# Altium footprint library ST封装.PcbLib: 1336 footprints (part 81 of 109)
Each footprint in its own frame and in the unit in brackets; x right, y up, seen from the top. Pads: shape width x height; smd on the part's side, far side on the other; paste and mask are expansions set on the pad; w line width, h text height; cw(c..) or ccw(c..) is an arc to the next point about the centre after c.
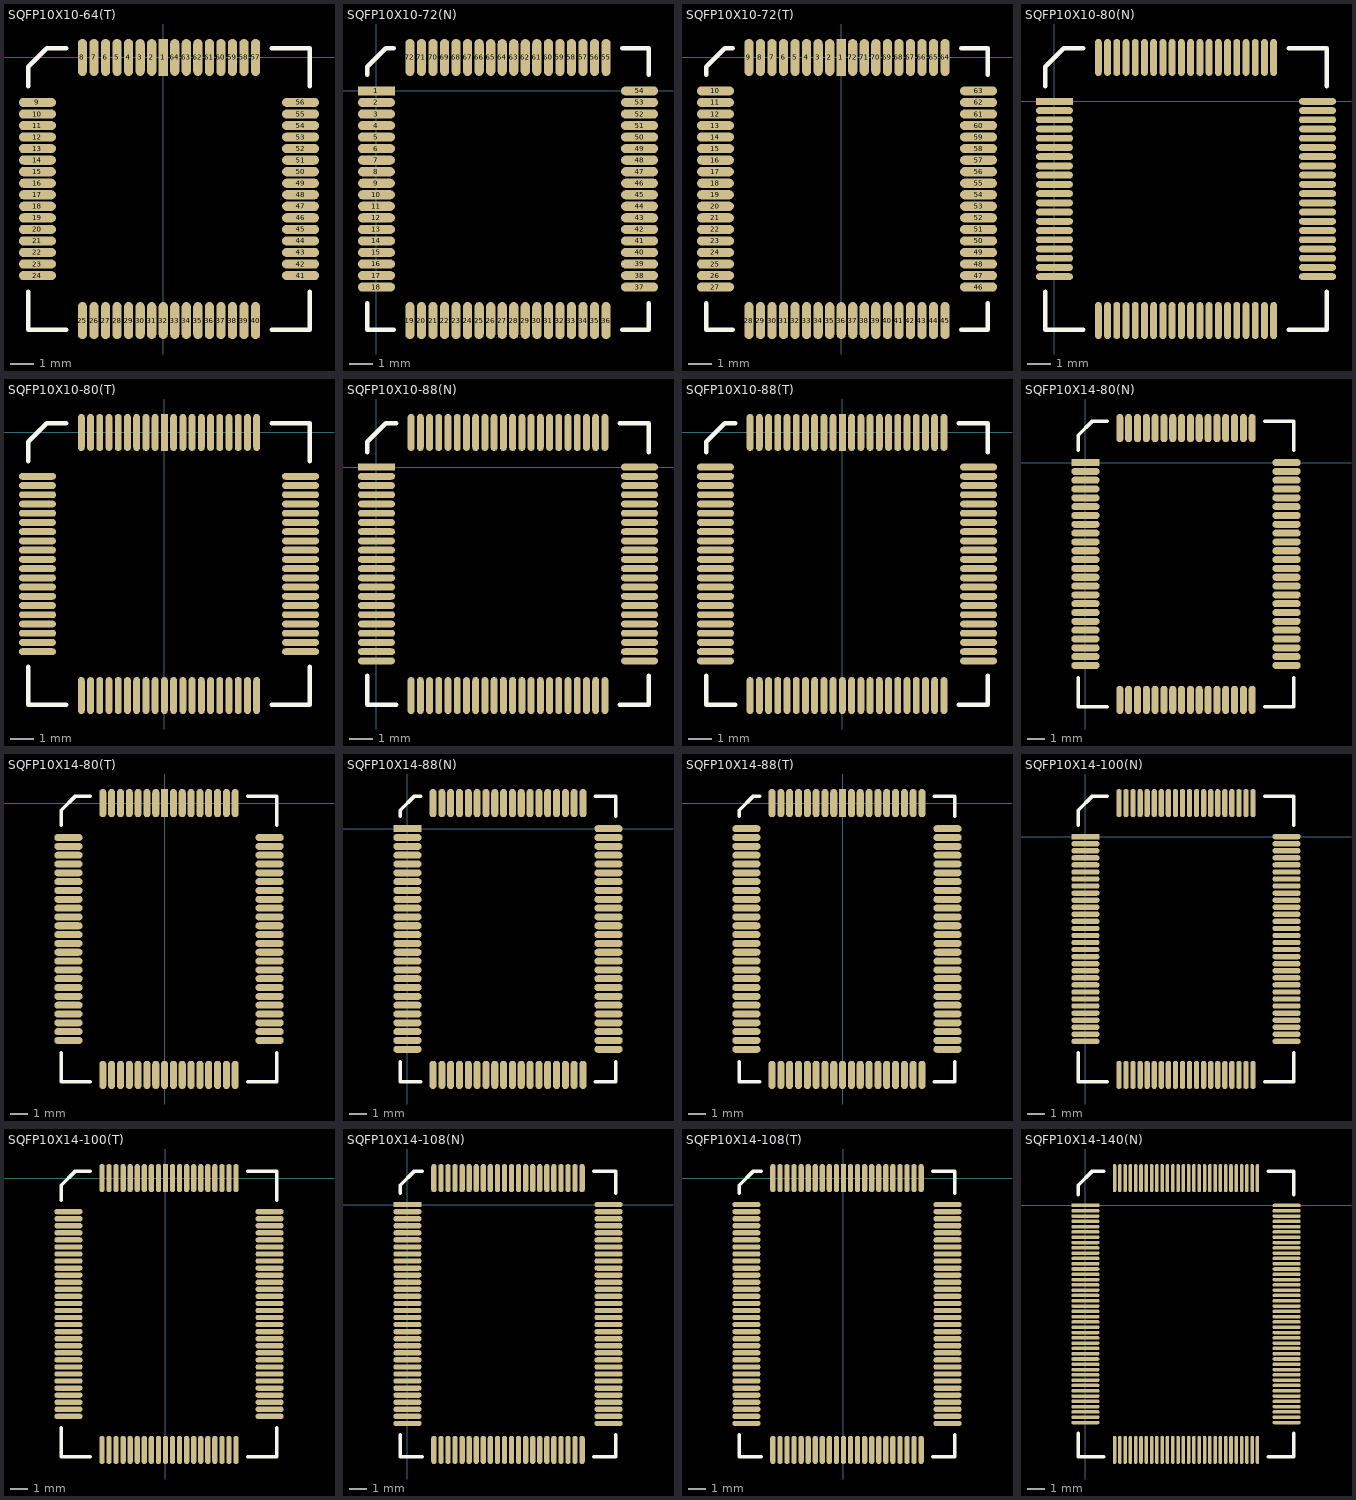
[diagram p80: the footprints below, top view; thin cyan lines are the x and y axes]

## SQFP10X10-64(T) [mm]
pads (64):
  rect 0.4x1.6 smd: 1(0,0)
  oval 0.4x1.6 smd: 2(-0.5,0) 3(-1,0) 4(-1.5,0) 5(-2,0) 6(-2.5,0) 7(-3,0) 8(-3.5,0) 25(-3.5,-11.4) 26(-3,-11.4) 27(-2.5,-11.4) 28(-2,-11.4) 29(-1.5,-11.4) 30(-1,-11.4) 31(-0.5,-11.4) 32(0,-11.4) 33(0.5,-11.4) 34(1,-11.4) 35(1.5,-11.4) 36(2,-11.4) 37(2.5,-11.4) 38(3,-11.4) 39(3.5,-11.4) 40(4,-11.4) 57(4,0) 58(3.5,0) 59(3,0) 60(2.5,0) 61(2,0) 62(1.5,0) 63(1,0) 64(0.5,0)
  oval 1.6x0.4 smd: 9(-5.45,-1.95) 10(-5.45,-2.45) 11(-5.45,-2.95) 12(-5.45,-3.45) 13(-5.45,-3.95) 14(-5.45,-4.45) 15(-5.45,-4.95) 16(-5.45,-5.45) 17(-5.45,-5.95) 18(-5.45,-6.45) 19(-5.45,-6.95) 20(-5.45,-7.45) 21(-5.45,-7.95) 22(-5.45,-8.45) 23(-5.45,-8.95) 24(-5.45,-9.45) 41(5.95,-9.45) 42(5.95,-8.95) 43(5.95,-8.45) 44(5.95,-7.95) 45(5.95,-7.45) 46(5.95,-6.95) 47(5.95,-6.45) 48(5.95,-5.95) 49(5.95,-5.45) 50(5.95,-4.95) 51(5.95,-4.45) 52(5.95,-3.95) 53(5.95,-3.45) 54(5.95,-2.95) 55(5.95,-2.45) 56(5.95,-1.95)
Top Overlay:
  lines w0.2: -5.85,-10.15 -5.85,-11.8 -4.2,-11.8 ; -5.85,-1.25 -5.85,-0.4 -5.05,0.4 -4.2,0.4 ; 4.7,-11.8 6.35,-11.8 6.35,-10.15 ; 4.7,0.4 6.35,0.4 6.35,-1.25

## SQFP10X10-72(N) [mm]
pads (72):
  rect 1.6x0.4 smd: 1(0,0)
  oval 1.6x0.4 smd: 2(0,-0.5) 3(0,-1) 4(0,-1.5) 5(0,-2) 6(0,-2.5) 7(0,-3) 8(0,-3.5) 9(0,-4) 10(0,-4.5) 11(0,-5) 12(0,-5.5) 13(0,-6) 14(0,-6.5) 15(0,-7) 16(0,-7.5) 17(0,-8) 18(0,-8.5) 37(11.4,-8.5) 38(11.4,-8) 39(11.4,-7.5) 40(11.4,-7) 41(11.4,-6.5) 42(11.4,-6) 43(11.4,-5.5) 44(11.4,-5) 45(11.4,-4.5) 46(11.4,-4) 47(11.4,-3.5) 48(11.4,-3) 49(11.4,-2.5) 50(11.4,-2) 51(11.4,-1.5) 52(11.4,-1) 53(11.4,-0.5) 54(11.4,0)
  oval 0.4x1.6 smd: 19(1.45,-9.95) 20(1.95,-9.95) 21(2.45,-9.95) 22(2.95,-9.95) 23(3.45,-9.95) 24(3.95,-9.95) 25(4.45,-9.95) 26(4.95,-9.95) 27(5.45,-9.95) 28(5.95,-9.95) 29(6.45,-9.95) 30(6.95,-9.95) 31(7.45,-9.95) 32(7.95,-9.95) 33(8.45,-9.95) 34(8.95,-9.95) 35(9.45,-9.95) 36(9.95,-9.95) 55(9.95,1.45) 56(9.45,1.45) 57(8.95,1.45) 58(8.45,1.45) 59(7.95,1.45) 60(7.45,1.45) 61(6.95,1.45) 62(6.45,1.45) 63(5.95,1.45) 64(5.45,1.45) 65(4.95,1.45) 66(4.45,1.45) 67(3.95,1.45) 68(3.45,1.45) 69(2.95,1.45) 70(2.45,1.45) 71(1.95,1.45) 72(1.45,1.45)
Top Overlay:
  lines w0.2: -0.4,-9.2 -0.4,-10.35 0.75,-10.35 ; -0.4,0.7 -0.4,1.05 0.4,1.85 0.75,1.85 ; 10.65,-10.35 11.8,-10.35 11.8,-9.2 ; 10.65,1.85 11.8,1.85 11.8,0.7

## SQFP10X10-72(T) [mm]
pads (72):
  rect 0.4x1.6 smd: 1(0,0)
  oval 0.4x1.6 smd: 2(-0.5,0) 3(-1,0) 4(-1.5,0) 5(-2,0) 6(-2.5,0) 7(-3,0) 8(-3.5,0) 9(-4,0) 28(-4,-11.4) 29(-3.5,-11.4) 30(-3,-11.4) 31(-2.5,-11.4) 32(-2,-11.4) 33(-1.5,-11.4) 34(-1,-11.4) 35(-0.5,-11.4) 36(0,-11.4) 37(0.5,-11.4) 38(1,-11.4) 39(1.5,-11.4) 40(2,-11.4) 41(2.5,-11.4) 42(3,-11.4) 43(3.5,-11.4) 44(4,-11.4) 45(4.5,-11.4) 64(4.5,0) 65(4,0) 66(3.5,0) 67(3,0) 68(2.5,0) 69(2,0) 70(1.5,0) 71(1,0) 72(0.5,0)
  oval 1.6x0.4 smd: 10(-5.45,-1.45) 11(-5.45,-1.95) 12(-5.45,-2.45) 13(-5.45,-2.95) 14(-5.45,-3.45) 15(-5.45,-3.95) 16(-5.45,-4.45) 17(-5.45,-4.95) 18(-5.45,-5.45) 19(-5.45,-5.95) 20(-5.45,-6.45) 21(-5.45,-6.95) 22(-5.45,-7.45) 23(-5.45,-7.95) 24(-5.45,-8.45) 25(-5.45,-8.95) 26(-5.45,-9.45) 27(-5.45,-9.95) 46(5.95,-9.95) 47(5.95,-9.45) 48(5.95,-8.95) 49(5.95,-8.45) 50(5.95,-7.95) 51(5.95,-7.45) 52(5.95,-6.95) 53(5.95,-6.45) 54(5.95,-5.95) 55(5.95,-5.45) 56(5.95,-4.95) 57(5.95,-4.45) 58(5.95,-3.95) 59(5.95,-3.45) 60(5.95,-2.95) 61(5.95,-2.45) 62(5.95,-1.95) 63(5.95,-1.45)
Top Overlay:
  lines w0.2: -5.85,-10.65 -5.85,-11.8 -4.7,-11.8 ; -5.85,-0.75 -5.85,-0.4 -5.05,0.4 -4.7,0.4 ; 5.2,-11.8 6.35,-11.8 6.35,-10.65 ; 5.2,0.4 6.35,0.4 6.35,-0.75

## SQFP10X10-80(N) [mm]
pads (80):
  rect 1.6x0.3 smd: 1(0,0)
  oval 1.6x0.3 smd: 2(0,-0.4) 3(0,-0.8) 4(0,-1.2) 5(0,-1.6) 6(0,-2) 7(0,-2.4) 8(0,-2.8) 9(0,-3.2) 10(0,-3.6) 11(0,-4) 12(0,-4.4) 13(0,-4.8) 14(0,-5.2) 15(0,-5.6) 16(0,-6) 17(0,-6.4) 18(0,-6.8) 19(0,-7.2) 20(0,-7.6) 41(11.4,-7.6) 42(11.4,-7.2) 43(11.4,-6.8) 44(11.4,-6.4) 45(11.4,-6) 46(11.4,-5.6) 47(11.4,-5.2) 48(11.4,-4.8) 49(11.4,-4.4) 50(11.4,-4) 51(11.4,-3.6) 52(11.4,-3.2) 53(11.4,-2.8) 54(11.4,-2.4) 55(11.4,-2) 56(11.4,-1.6) 57(11.4,-1.2) 58(11.4,-0.8) 59(11.4,-0.4) 60(11.4,0)
  oval 0.3x1.6 smd: 21(1.9,-9.5) 22(2.3,-9.5) 23(2.7,-9.5) 24(3.1,-9.5) 25(3.5,-9.5) 26(3.9,-9.5) 27(4.3,-9.5) 28(4.7,-9.5) 29(5.1,-9.5) 30(5.5,-9.5) 31(5.9,-9.5) 32(6.3,-9.5) 33(6.7,-9.5) 34(7.1,-9.5) 35(7.5,-9.5) 36(7.9,-9.5) 37(8.3,-9.5) 38(8.7,-9.5) 39(9.1,-9.5) 40(9.5,-9.5) 61(9.5,1.9) 62(9.1,1.9) 63(8.7,1.9) 64(8.3,1.9) 65(7.9,1.9) 66(7.5,1.9) 67(7.1,1.9) 68(6.7,1.9) 69(6.3,1.9) 70(5.9,1.9) 71(5.5,1.9) 72(5.1,1.9) 73(4.7,1.9) 74(4.3,1.9) 75(3.9,1.9) 76(3.5,1.9) 77(3.1,1.9) 78(2.7,1.9) 79(2.3,1.9) 80(1.9,1.9)
Top Overlay:
  lines w0.2: -0.4,-8.25 -0.4,-9.9 1.25,-9.9 ; -0.4,0.65 -0.4,1.5 0.4,2.3 1.25,2.3 ; 10.15,-9.9 11.8,-9.9 11.8,-8.25 ; 10.15,2.3 11.8,2.3 11.8,0.65

## SQFP10X10-80(T) [mm]
pads (80):
  rect 0.3x1.6 smd: 1(0,0)
  oval 0.3x1.6 smd: 2(-0.4,0) 3(-0.8,0) 4(-1.2,0) 5(-1.6,0) 6(-2,0) 7(-2.4,0) 8(-2.8,0) 9(-3.2,0) 10(-3.6,0) 31(-3.6,-11.4) 32(-3.2,-11.4) 33(-2.8,-11.4) 34(-2.4,-11.4) 35(-2,-11.4) 36(-1.6,-11.4) 37(-1.2,-11.4) 38(-0.8,-11.4) 39(-0.4,-11.4) 40(0,-11.4) 41(0.4,-11.4) 42(0.8,-11.4) 43(1.2,-11.4) 44(1.6,-11.4) 45(2,-11.4) 46(2.4,-11.4) 47(2.8,-11.4) 48(3.2,-11.4) 49(3.6,-11.4) 50(4,-11.4) 71(4,0) 72(3.6,0) 73(3.2,0) 74(2.8,0) 75(2.4,0) 76(2,0) 77(1.6,0) 78(1.2,0) 79(0.8,0) 80(0.4,0)
  oval 1.6x0.3 smd: 11(-5.5,-1.9) 12(-5.5,-2.3) 13(-5.5,-2.7) 14(-5.5,-3.1) 15(-5.5,-3.5) 16(-5.5,-3.9) 17(-5.5,-4.3) 18(-5.5,-4.7) 19(-5.5,-5.1) 20(-5.5,-5.5) 21(-5.5,-5.9) 22(-5.5,-6.3) 23(-5.5,-6.7) 24(-5.5,-7.1) 25(-5.5,-7.5) 26(-5.5,-7.9) 27(-5.5,-8.3) 28(-5.5,-8.7) 29(-5.5,-9.1) 30(-5.5,-9.5) 51(5.9,-9.5) 52(5.9,-9.1) 53(5.9,-8.7) 54(5.9,-8.3) 55(5.9,-7.9) 56(5.9,-7.5) 57(5.9,-7.1) 58(5.9,-6.7) 59(5.9,-6.3) 60(5.9,-5.9) 61(5.9,-5.5) 62(5.9,-5.1) 63(5.9,-4.7) 64(5.9,-4.3) 65(5.9,-3.9) 66(5.9,-3.5) 67(5.9,-3.1) 68(5.9,-2.7) 69(5.9,-2.3) 70(5.9,-1.9)
Top Overlay:
  lines w0.2: -5.9,-10.15 -5.9,-11.8 -4.25,-11.8 ; -5.9,-1.25 -5.9,-0.4 -5.1,0.4 -4.25,0.4 ; 4.65,-11.8 6.3,-11.8 6.3,-10.15 ; 4.65,0.4 6.3,0.4 6.3,-1.25

## SQFP10X10-88(N) [mm]
pads (88):
  rect 1.6x0.3 smd: 1(0,0)
  oval 1.6x0.3 smd: 2(0,-0.4) 3(0,-0.8) 4(0,-1.2) 5(0,-1.6) 6(0,-2) 7(0,-2.4) 8(0,-2.8) 9(0,-3.2) 10(0,-3.6) 11(0,-4) 12(0,-4.4) 13(0,-4.8) 14(0,-5.2) 15(0,-5.6) 16(0,-6) 17(0,-6.4) 18(0,-6.8) 19(0,-7.2) 20(0,-7.6) 21(0,-8) 22(0,-8.4) 45(11.4,-8.4) 46(11.4,-8) 47(11.4,-7.6) 48(11.4,-7.2) 49(11.4,-6.8) 50(11.4,-6.4) 51(11.4,-6) 52(11.4,-5.6) 53(11.4,-5.2) 54(11.4,-4.8) 55(11.4,-4.4) 56(11.4,-4) 57(11.4,-3.6) 58(11.4,-3.2) 59(11.4,-2.8) 60(11.4,-2.4) 61(11.4,-2) 62(11.4,-1.6) 63(11.4,-1.2) 64(11.4,-0.8) 65(11.4,-0.4) 66(11.4,0)
  oval 0.3x1.6 smd: 23(1.5,-9.9) 24(1.9,-9.9) 25(2.3,-9.9) 26(2.7,-9.9) 27(3.1,-9.9) 28(3.5,-9.9) 29(3.9,-9.9) 30(4.3,-9.9) 31(4.7,-9.9) 32(5.1,-9.9) 33(5.5,-9.9) 34(5.9,-9.9) 35(6.3,-9.9) 36(6.7,-9.9) 37(7.1,-9.9) 38(7.5,-9.9) 39(7.9,-9.9) 40(8.3,-9.9) 41(8.7,-9.9) 42(9.1,-9.9) 43(9.5,-9.9) 44(9.9,-9.9) 67(9.9,1.5) 68(9.5,1.5) 69(9.1,1.5) 70(8.7,1.5) 71(8.3,1.5) 72(7.9,1.5) 73(7.5,1.5) 74(7.1,1.5) 75(6.7,1.5) 76(6.3,1.5) 77(5.9,1.5) 78(5.5,1.5) 79(5.1,1.5) 80(4.7,1.5) 81(4.3,1.5) 82(3.9,1.5) 83(3.5,1.5) 84(3.1,1.5) 85(2.7,1.5) 86(2.3,1.5) 87(1.9,1.5) 88(1.5,1.5)
Top Overlay:
  lines w0.2: -0.4,-9.05 -0.4,-10.3 0.85,-10.3 ; -0.4,0.65 -0.4,1.1 0.4,1.9 0.85,1.9 ; 10.55,-10.3 11.8,-10.3 11.8,-9.05 ; 10.55,1.9 11.8,1.9 11.8,0.65

## SQFP10X10-88(T) [mm]
pads (88):
  rect 0.3x1.6 smd: 1(0,0)
  oval 0.3x1.6 smd: 2(-0.4,0) 3(-0.8,0) 4(-1.2,0) 5(-1.6,0) 6(-2,0) 7(-2.4,0) 8(-2.8,0) 9(-3.2,0) 10(-3.6,0) 11(-4,0) 34(-4,-11.4) 35(-3.6,-11.4) 36(-3.2,-11.4) 37(-2.8,-11.4) 38(-2.4,-11.4) 39(-2,-11.4) 40(-1.6,-11.4) 41(-1.2,-11.4) 42(-0.8,-11.4) 43(-0.4,-11.4) 44(0,-11.4) 45(0.4,-11.4) 46(0.8,-11.4) 47(1.2,-11.4) 48(1.6,-11.4) 49(2,-11.4) 50(2.4,-11.4) 51(2.8,-11.4) 52(3.2,-11.4) 53(3.6,-11.4) 54(4,-11.4) 55(4.4,-11.4) 78(4.4,0) 79(4,0) 80(3.6,0) 81(3.2,0) 82(2.8,0) 83(2.4,0) 84(2,0) 85(1.6,0) 86(1.2,0) 87(0.8,0) 88(0.4,0)
  oval 1.6x0.3 smd: 12(-5.5,-1.5) 13(-5.5,-1.9) 14(-5.5,-2.3) 15(-5.5,-2.7) 16(-5.5,-3.1) 17(-5.5,-3.5) 18(-5.5,-3.9) 19(-5.5,-4.3) 20(-5.5,-4.7) 21(-5.5,-5.1) 22(-5.5,-5.5) 23(-5.5,-5.9) 24(-5.5,-6.3) 25(-5.5,-6.7) 26(-5.5,-7.1) 27(-5.5,-7.5) 28(-5.5,-7.9) 29(-5.5,-8.3) 30(-5.5,-8.7) 31(-5.5,-9.1) 32(-5.5,-9.5) 33(-5.5,-9.9) 56(5.9,-9.9) 57(5.9,-9.5) 58(5.9,-9.1) 59(5.9,-8.7) 60(5.9,-8.3) 61(5.9,-7.9) 62(5.9,-7.5) 63(5.9,-7.1) 64(5.9,-6.7) 65(5.9,-6.3) 66(5.9,-5.9) 67(5.9,-5.5) 68(5.9,-5.1) 69(5.9,-4.7) 70(5.9,-4.3) 71(5.9,-3.9) 72(5.9,-3.5) 73(5.9,-3.1) 74(5.9,-2.7) 75(5.9,-2.3) 76(5.9,-1.9) 77(5.9,-1.5)
Top Overlay:
  lines w0.2: -5.9,-10.55 -5.9,-11.8 -4.65,-11.8 ; -5.9,-0.85 -5.9,-0.4 -5.1,0.4 -4.65,0.4 ; 5.05,-11.8 6.3,-11.8 6.3,-10.55 ; 5.05,0.4 6.3,0.4 6.3,-0.85

## SQFP10X14-80(N) [mm]
pads (80):
  rect 1.6x0.4 smd: 1(0,0)
  oval 1.6x0.4 smd: 2(0,-0.5) 3(0,-1) 4(0,-1.5) 5(0,-2) 6(0,-2.5) 7(0,-3) 8(0,-3.5) 9(0,-4) 10(0,-4.5) 11(0,-5) 12(0,-5.5) 13(0,-6) 14(0,-6.5) 15(0,-7) 16(0,-7.5) 17(0,-8) 18(0,-8.5) 19(0,-9) 20(0,-9.5) 21(0,-10) 22(0,-10.5) 23(0,-11) 24(0,-11.5) 41(11.4,-11.5) 42(11.4,-11) 43(11.4,-10.5) 44(11.4,-10) 45(11.4,-9.5) 46(11.4,-9) 47(11.4,-8.5) 48(11.4,-8) 49(11.4,-7.5) 50(11.4,-7) 51(11.4,-6.5) 52(11.4,-6) 53(11.4,-5.5) 54(11.4,-5) 55(11.4,-4.5) 56(11.4,-4) 57(11.4,-3.5) 58(11.4,-3) 59(11.4,-2.5) 60(11.4,-2) 61(11.4,-1.5) 62(11.4,-1) 63(11.4,-0.5) 64(11.4,0)
  oval 0.4x1.6 smd: 25(1.95,-13.45) 26(2.45,-13.45) 27(2.95,-13.45) 28(3.45,-13.45) 29(3.95,-13.45) 30(4.45,-13.45) 31(4.95,-13.45) 32(5.45,-13.45) 33(5.95,-13.45) 34(6.45,-13.45) 35(6.95,-13.45) 36(7.45,-13.45) 37(7.95,-13.45) 38(8.45,-13.45) 39(8.95,-13.45) 40(9.45,-13.45) 65(9.45,1.95) 66(8.95,1.95) 67(8.45,1.95) 68(7.95,1.95) 69(7.45,1.95) 70(6.95,1.95) 71(6.45,1.95) 72(5.95,1.95) 73(5.45,1.95) 74(4.95,1.95) 75(4.45,1.95) 76(3.95,1.95) 77(3.45,1.95) 78(2.95,1.95) 79(2.45,1.95) 80(1.95,1.95)
Top Overlay:
  lines w0.2: -0.4,-12.2 -0.4,-13.85 1.25,-13.85 ; -0.4,0.7 -0.4,1.55 0.4,2.35 1.25,2.35 ; 10.15,-13.85 11.8,-13.85 11.8,-12.2 ; 10.15,2.35 11.8,2.35 11.8,0.7

## SQFP10X14-80(T) [mm]
pads (80):
  rect 0.4x1.6 smd: 1(0,0)
  oval 0.4x1.6 smd: 2(-0.5,0) 3(-1,0) 4(-1.5,0) 5(-2,0) 6(-2.5,0) 7(-3,0) 8(-3.5,0) 33(-3.5,-15.4) 34(-3,-15.4) 35(-2.5,-15.4) 36(-2,-15.4) 37(-1.5,-15.4) 38(-1,-15.4) 39(-0.5,-15.4) 40(0,-15.4) 41(0.5,-15.4) 42(1,-15.4) 43(1.5,-15.4) 44(2,-15.4) 45(2.5,-15.4) 46(3,-15.4) 47(3.5,-15.4) 48(4,-15.4) 73(4,0) 74(3.5,0) 75(3,0) 76(2.5,0) 77(2,0) 78(1.5,0) 79(1,0) 80(0.5,0)
  oval 1.6x0.4 smd: 9(-5.45,-1.95) 10(-5.45,-2.45) 11(-5.45,-2.95) 12(-5.45,-3.45) 13(-5.45,-3.95) 14(-5.45,-4.45) 15(-5.45,-4.95) 16(-5.45,-5.45) 17(-5.45,-5.95) 18(-5.45,-6.45) 19(-5.45,-6.95) 20(-5.45,-7.45) 21(-5.45,-7.95) 22(-5.45,-8.45) 23(-5.45,-8.95) 24(-5.45,-9.45) 25(-5.45,-9.95) 26(-5.45,-10.45) 27(-5.45,-10.95) 28(-5.45,-11.45) 29(-5.45,-11.95) 30(-5.45,-12.45) 31(-5.45,-12.95) 32(-5.45,-13.45) 49(5.95,-13.45) 50(5.95,-12.95) 51(5.95,-12.45) 52(5.95,-11.95) 53(5.95,-11.45) 54(5.95,-10.95) 55(5.95,-10.45) 56(5.95,-9.95) 57(5.95,-9.45) 58(5.95,-8.95) 59(5.95,-8.45) 60(5.95,-7.95) 61(5.95,-7.45) 62(5.95,-6.95) 63(5.95,-6.45) 64(5.95,-5.95) 65(5.95,-5.45) 66(5.95,-4.95) 67(5.95,-4.45) 68(5.95,-3.95) 69(5.95,-3.45) 70(5.95,-2.95) 71(5.95,-2.45) 72(5.95,-1.95)
Top Overlay:
  lines w0.2: -5.85,-14.15 -5.85,-15.8 -4.2,-15.8 ; -5.85,-1.25 -5.85,-0.4 -5.05,0.4 -4.2,0.4 ; 4.7,-15.8 6.35,-15.8 6.35,-14.15 ; 4.7,0.4 6.35,0.4 6.35,-1.25

## SQFP10X14-88(N) [mm]
pads (88):
  rect 1.6x0.4 smd: 1(0,0)
  oval 1.6x0.4 smd: 2(0,-0.5) 3(0,-1) 4(0,-1.5) 5(0,-2) 6(0,-2.5) 7(0,-3) 8(0,-3.5) 9(0,-4) 10(0,-4.5) 11(0,-5) 12(0,-5.5) 13(0,-6) 14(0,-6.5) 15(0,-7) 16(0,-7.5) 17(0,-8) 18(0,-8.5) 19(0,-9) 20(0,-9.5) 21(0,-10) 22(0,-10.5) 23(0,-11) 24(0,-11.5) 25(0,-12) 26(0,-12.5) 45(11.4,-12.5) 46(11.4,-12) 47(11.4,-11.5) 48(11.4,-11) 49(11.4,-10.5) 50(11.4,-10) 51(11.4,-9.5) 52(11.4,-9) 53(11.4,-8.5) 54(11.4,-8) 55(11.4,-7.5) 56(11.4,-7) 57(11.4,-6.5) 58(11.4,-6) 59(11.4,-5.5) 60(11.4,-5) 61(11.4,-4.5) 62(11.4,-4) 63(11.4,-3.5) 64(11.4,-3) 65(11.4,-2.5) 66(11.4,-2) 67(11.4,-1.5) 68(11.4,-1) 69(11.4,-0.5) 70(11.4,0)
  oval 0.4x1.6 smd: 27(1.45,-13.95) 28(1.95,-13.95) 29(2.45,-13.95) 30(2.95,-13.95) 31(3.45,-13.95) 32(3.95,-13.95) 33(4.45,-13.95) 34(4.95,-13.95) 35(5.45,-13.95) 36(5.95,-13.95) 37(6.45,-13.95) 38(6.95,-13.95) 39(7.45,-13.95) 40(7.95,-13.95) 41(8.45,-13.95) 42(8.95,-13.95) 43(9.45,-13.95) 44(9.95,-13.95) 71(9.95,1.45) 72(9.45,1.45) 73(8.95,1.45) 74(8.45,1.45) 75(7.95,1.45) 76(7.45,1.45) 77(6.95,1.45) 78(6.45,1.45) 79(5.95,1.45) 80(5.45,1.45) 81(4.95,1.45) 82(4.45,1.45) 83(3.95,1.45) 84(3.45,1.45) 85(2.95,1.45) 86(2.45,1.45) 87(1.95,1.45) 88(1.45,1.45)
Top Overlay:
  lines w0.2: -0.4,-13.2 -0.4,-14.35 0.75,-14.35 ; -0.4,0.7 -0.4,1.05 0.4,1.85 0.75,1.85 ; 10.65,-14.35 11.8,-14.35 11.8,-13.2 ; 10.65,1.85 11.8,1.85 11.8,0.7

## SQFP10X14-88(T) [mm]
pads (88):
  rect 0.4x1.6 smd: 1(0,0)
  oval 0.4x1.6 smd: 2(-0.5,0) 3(-1,0) 4(-1.5,0) 5(-2,0) 6(-2.5,0) 7(-3,0) 8(-3.5,0) 9(-4,0) 36(-4,-15.4) 37(-3.5,-15.4) 38(-3,-15.4) 39(-2.5,-15.4) 40(-2,-15.4) 41(-1.5,-15.4) 42(-1,-15.4) 43(-0.5,-15.4) 44(0,-15.4) 45(0.5,-15.4) 46(1,-15.4) 47(1.5,-15.4) 48(2,-15.4) 49(2.5,-15.4) 50(3,-15.4) 51(3.5,-15.4) 52(4,-15.4) 53(4.5,-15.4) 80(4.5,0) 81(4,0) 82(3.5,0) 83(3,0) 84(2.5,0) 85(2,0) 86(1.5,0) 87(1,0) 88(0.5,0)
  oval 1.6x0.4 smd: 10(-5.45,-1.45) 11(-5.45,-1.95) 12(-5.45,-2.45) 13(-5.45,-2.95) 14(-5.45,-3.45) 15(-5.45,-3.95) 16(-5.45,-4.45) 17(-5.45,-4.95) 18(-5.45,-5.45) 19(-5.45,-5.95) 20(-5.45,-6.45) 21(-5.45,-6.95) 22(-5.45,-7.45) 23(-5.45,-7.95) 24(-5.45,-8.45) 25(-5.45,-8.95) 26(-5.45,-9.45) 27(-5.45,-9.95) 28(-5.45,-10.45) 29(-5.45,-10.95) 30(-5.45,-11.45) 31(-5.45,-11.95) 32(-5.45,-12.45) 33(-5.45,-12.95) 34(-5.45,-13.45) 35(-5.45,-13.95) 54(5.95,-13.95) 55(5.95,-13.45) 56(5.95,-12.95) 57(5.95,-12.45) 58(5.95,-11.95) 59(5.95,-11.45) 60(5.95,-10.95) 61(5.95,-10.45) 62(5.95,-9.95) 63(5.95,-9.45) 64(5.95,-8.95) 65(5.95,-8.45) 66(5.95,-7.95) 67(5.95,-7.45) 68(5.95,-6.95) 69(5.95,-6.45) 70(5.95,-5.95) 71(5.95,-5.45) 72(5.95,-4.95) 73(5.95,-4.45) 74(5.95,-3.95) 75(5.95,-3.45) 76(5.95,-2.95) 77(5.95,-2.45) 78(5.95,-1.95) 79(5.95,-1.45)
Top Overlay:
  lines w0.2: -5.85,-14.65 -5.85,-15.8 -4.7,-15.8 ; -5.85,-0.75 -5.85,-0.4 -5.05,0.4 -4.7,0.4 ; 5.2,-15.8 6.35,-15.8 6.35,-14.65 ; 5.2,0.4 6.35,0.4 6.35,-0.75

## SQFP10X14-100(N) [mm]
pads (100):
  rect 1.6x0.3 smd: 1(0,0)
  oval 1.6x0.3 smd: 2(0,-0.4) 3(0,-0.8) 4(0,-1.2) 5(0,-1.6) 6(0,-2) 7(0,-2.4) 8(0,-2.8) 9(0,-3.2) 10(0,-3.6) 11(0,-4) 12(0,-4.4) 13(0,-4.8) 14(0,-5.2) 15(0,-5.6) 16(0,-6) 17(0,-6.4) 18(0,-6.8) 19(0,-7.2) 20(0,-7.6) 21(0,-8) 22(0,-8.4) 23(0,-8.8) 24(0,-9.2) 25(0,-9.6) 26(0,-10) 27(0,-10.4) 28(0,-10.8) 29(0,-11.2) 30(0,-11.6) 51(11.4,-11.6) 52(11.4,-11.2) 53(11.4,-10.8) 54(11.4,-10.4) 55(11.4,-10) 56(11.4,-9.6) 57(11.4,-9.2) 58(11.4,-8.8) 59(11.4,-8.4) 60(11.4,-8) 61(11.4,-7.6) 62(11.4,-7.2) 63(11.4,-6.8) 64(11.4,-6.4) 65(11.4,-6) 66(11.4,-5.6) 67(11.4,-5.2) 68(11.4,-4.8) 69(11.4,-4.4) 70(11.4,-4) 71(11.4,-3.6) 72(11.4,-3.2) 73(11.4,-2.8) 74(11.4,-2.4) 75(11.4,-2) 76(11.4,-1.6) 77(11.4,-1.2) 78(11.4,-0.8) 79(11.4,-0.4) 80(11.4,0)
  oval 0.3x1.6 smd: 31(1.9,-13.5) 32(2.3,-13.5) 33(2.7,-13.5) 34(3.1,-13.5) 35(3.5,-13.5) 36(3.9,-13.5) 37(4.3,-13.5) 38(4.7,-13.5) 39(5.1,-13.5) 40(5.5,-13.5) 41(5.9,-13.5) 42(6.3,-13.5) 43(6.7,-13.5) 44(7.1,-13.5) 45(7.5,-13.5) 46(7.9,-13.5) 47(8.3,-13.5) 48(8.7,-13.5) 49(9.1,-13.5) 50(9.5,-13.5) 81(9.5,1.9) 82(9.1,1.9) 83(8.7,1.9) 84(8.3,1.9) 85(7.9,1.9) 86(7.5,1.9) 87(7.1,1.9) 88(6.7,1.9) 89(6.3,1.9) 90(5.9,1.9) 91(5.5,1.9) 92(5.1,1.9) 93(4.7,1.9) 94(4.3,1.9) 95(3.9,1.9) 96(3.5,1.9) 97(3.1,1.9) 98(2.7,1.9) 99(2.3,1.9) 100(1.9,1.9)
Top Overlay:
  lines w0.2: -0.4,-12.25 -0.4,-13.9 1.25,-13.9 ; -0.4,0.65 -0.4,1.5 0.4,2.3 1.25,2.3 ; 10.15,-13.9 11.8,-13.9 11.8,-12.25 ; 10.15,2.3 11.8,2.3 11.8,0.65

## SQFP10X14-100(T) [mm]
pads (100):
  rect 0.3x1.6 smd: 1(0,0)
  oval 0.3x1.6 smd: 2(-0.4,0) 3(-0.8,0) 4(-1.2,0) 5(-1.6,0) 6(-2,0) 7(-2.4,0) 8(-2.8,0) 9(-3.2,0) 10(-3.6,0) 41(-3.6,-15.4) 42(-3.2,-15.4) 43(-2.8,-15.4) 44(-2.4,-15.4) 45(-2,-15.4) 46(-1.6,-15.4) 47(-1.2,-15.4) 48(-0.8,-15.4) 49(-0.4,-15.4) 50(0,-15.4) 51(0.4,-15.4) 52(0.8,-15.4) 53(1.2,-15.4) 54(1.6,-15.4) 55(2,-15.4) 56(2.4,-15.4) 57(2.8,-15.4) 58(3.2,-15.4) 59(3.6,-15.4) 60(4,-15.4) 91(4,0) 92(3.6,0) 93(3.2,0) 94(2.8,0) 95(2.4,0) 96(2,0) 97(1.6,0) 98(1.2,0) 99(0.8,0) 100(0.4,0)
  oval 1.6x0.3 smd: 11(-5.5,-1.9) 12(-5.5,-2.3) 13(-5.5,-2.7) 14(-5.5,-3.1) 15(-5.5,-3.5) 16(-5.5,-3.9) 17(-5.5,-4.3) 18(-5.5,-4.7) 19(-5.5,-5.1) 20(-5.5,-5.5) 21(-5.5,-5.9) 22(-5.5,-6.3) 23(-5.5,-6.7) 24(-5.5,-7.1) 25(-5.5,-7.5) 26(-5.5,-7.9) 27(-5.5,-8.3) 28(-5.5,-8.7) 29(-5.5,-9.1) 30(-5.5,-9.5) 31(-5.5,-9.9) 32(-5.5,-10.3) 33(-5.5,-10.7) 34(-5.5,-11.1) 35(-5.5,-11.5) 36(-5.5,-11.9) 37(-5.5,-12.3) 38(-5.5,-12.7) 39(-5.5,-13.1) 40(-5.5,-13.5) 61(5.9,-13.5) 62(5.9,-13.1) 63(5.9,-12.7) 64(5.9,-12.3) 65(5.9,-11.9) 66(5.9,-11.5) 67(5.9,-11.1) 68(5.9,-10.7) 69(5.9,-10.3) 70(5.9,-9.9) 71(5.9,-9.5) 72(5.9,-9.1) 73(5.9,-8.7) 74(5.9,-8.3) 75(5.9,-7.9) 76(5.9,-7.5) 77(5.9,-7.1) 78(5.9,-6.7) 79(5.9,-6.3) 80(5.9,-5.9) 81(5.9,-5.5) 82(5.9,-5.1) 83(5.9,-4.7) 84(5.9,-4.3) 85(5.9,-3.9) 86(5.9,-3.5) 87(5.9,-3.1) 88(5.9,-2.7) 89(5.9,-2.3) 90(5.9,-1.9)
Top Overlay:
  lines w0.2: -5.9,-14.15 -5.9,-15.8 -4.25,-15.8 ; -5.9,-1.25 -5.9,-0.4 -5.1,0.4 -4.25,0.4 ; 4.65,-15.8 6.3,-15.8 6.3,-14.15 ; 4.65,0.4 6.3,0.4 6.3,-1.25

## SQFP10X14-108(N) [mm]
pads (108):
  rect 1.6x0.3 smd: 1(0,0)
  oval 1.6x0.3 smd: 2(0,-0.4) 3(0,-0.8) 4(0,-1.2) 5(0,-1.6) 6(0,-2) 7(0,-2.4) 8(0,-2.8) 9(0,-3.2) 10(0,-3.6) 11(0,-4) 12(0,-4.4) 13(0,-4.8) 14(0,-5.2) 15(0,-5.6) 16(0,-6) 17(0,-6.4) 18(0,-6.8) 19(0,-7.2) 20(0,-7.6) 21(0,-8) 22(0,-8.4) 23(0,-8.8) 24(0,-9.2) 25(0,-9.6) 26(0,-10) 27(0,-10.4) 28(0,-10.8) 29(0,-11.2) 30(0,-11.6) 31(0,-12) 32(0,-12.4) 55(11.4,-12.4) 56(11.4,-12) 57(11.4,-11.6) 58(11.4,-11.2) 59(11.4,-10.8) 60(11.4,-10.4) 61(11.4,-10) 62(11.4,-9.6) 63(11.4,-9.2) 64(11.4,-8.8) 65(11.4,-8.4) 66(11.4,-8) 67(11.4,-7.6) 68(11.4,-7.2) 69(11.4,-6.8) 70(11.4,-6.4) 71(11.4,-6) 72(11.4,-5.6) 73(11.4,-5.2) 74(11.4,-4.8) 75(11.4,-4.4) 76(11.4,-4) 77(11.4,-3.6) 78(11.4,-3.2) 79(11.4,-2.8) 80(11.4,-2.4) 81(11.4,-2) 82(11.4,-1.6) 83(11.4,-1.2) 84(11.4,-0.8) 85(11.4,-0.4) 86(11.4,0)
  oval 0.3x1.6 smd: 33(1.5,-13.9) 34(1.9,-13.9) 35(2.3,-13.9) 36(2.7,-13.9) 37(3.1,-13.9) 38(3.5,-13.9) 39(3.9,-13.9) 40(4.3,-13.9) 41(4.7,-13.9) 42(5.1,-13.9) 43(5.5,-13.9) 44(5.9,-13.9) 45(6.3,-13.9) 46(6.7,-13.9) 47(7.1,-13.9) 48(7.5,-13.9) 49(7.9,-13.9) 50(8.3,-13.9) 51(8.7,-13.9) 52(9.1,-13.9) 53(9.5,-13.9) 54(9.9,-13.9) 87(9.9,1.5) 88(9.5,1.5) 89(9.1,1.5) 90(8.7,1.5) 91(8.3,1.5) 92(7.9,1.5) 93(7.5,1.5) 94(7.1,1.5) 95(6.7,1.5) 96(6.3,1.5) 97(5.9,1.5) 98(5.5,1.5) 99(5.1,1.5) 100(4.7,1.5) 101(4.3,1.5) 102(3.9,1.5) 103(3.5,1.5) 104(3.1,1.5) 105(2.7,1.5) 106(2.3,1.5) 107(1.9,1.5) 108(1.5,1.5)
Top Overlay:
  lines w0.2: -0.4,-13.05 -0.4,-14.3 0.85,-14.3 ; -0.4,0.65 -0.4,1.1 0.4,1.9 0.85,1.9 ; 10.55,-14.3 11.8,-14.3 11.8,-13.05 ; 10.55,1.9 11.8,1.9 11.8,0.65

## SQFP10X14-108(T) [mm]
pads (108):
  rect 0.3x1.6 smd: 1(0,0)
  oval 0.3x1.6 smd: 2(-0.4,0) 3(-0.8,0) 4(-1.2,0) 5(-1.6,0) 6(-2,0) 7(-2.4,0) 8(-2.8,0) 9(-3.2,0) 10(-3.6,0) 11(-4,0) 44(-4,-15.4) 45(-3.6,-15.4) 46(-3.2,-15.4) 47(-2.8,-15.4) 48(-2.4,-15.4) 49(-2,-15.4) 50(-1.6,-15.4) 51(-1.2,-15.4) 52(-0.8,-15.4) 53(-0.4,-15.4) 54(0,-15.4) 55(0.4,-15.4) 56(0.8,-15.4) 57(1.2,-15.4) 58(1.6,-15.4) 59(2,-15.4) 60(2.4,-15.4) 61(2.8,-15.4) 62(3.2,-15.4) 63(3.6,-15.4) 64(4,-15.4) 65(4.4,-15.4) 98(4.4,0) 99(4,0) 100(3.6,0) 101(3.2,0) 102(2.8,0) 103(2.4,0) 104(2,0) 105(1.6,0) 106(1.2,0) 107(0.8,0) 108(0.4,0)
  oval 1.6x0.3 smd: 12(-5.5,-1.5) 13(-5.5,-1.9) 14(-5.5,-2.3) 15(-5.5,-2.7) 16(-5.5,-3.1) 17(-5.5,-3.5) 18(-5.5,-3.9) 19(-5.5,-4.3) 20(-5.5,-4.7) 21(-5.5,-5.1) 22(-5.5,-5.5) 23(-5.5,-5.9) 24(-5.5,-6.3) 25(-5.5,-6.7) 26(-5.5,-7.1) 27(-5.5,-7.5) 28(-5.5,-7.9) 29(-5.5,-8.3) 30(-5.5,-8.7) 31(-5.5,-9.1) 32(-5.5,-9.5) 33(-5.5,-9.9) 34(-5.5,-10.3) 35(-5.5,-10.7) 36(-5.5,-11.1) 37(-5.5,-11.5) 38(-5.5,-11.9) 39(-5.5,-12.3) 40(-5.5,-12.7) 41(-5.5,-13.1) 42(-5.5,-13.5) 43(-5.5,-13.9) 66(5.9,-13.9) 67(5.9,-13.5) 68(5.9,-13.1) 69(5.9,-12.7) 70(5.9,-12.3) 71(5.9,-11.9) 72(5.9,-11.5) 73(5.9,-11.1) 74(5.9,-10.7) 75(5.9,-10.3) 76(5.9,-9.9) 77(5.9,-9.5) 78(5.9,-9.1) 79(5.9,-8.7) 80(5.9,-8.3) 81(5.9,-7.9) 82(5.9,-7.5) 83(5.9,-7.1) 84(5.9,-6.7) 85(5.9,-6.3) 86(5.9,-5.9) 87(5.9,-5.5) 88(5.9,-5.1) 89(5.9,-4.7) 90(5.9,-4.3) 91(5.9,-3.9) 92(5.9,-3.5) 93(5.9,-3.1) 94(5.9,-2.7) 95(5.9,-2.3) 96(5.9,-1.9) 97(5.9,-1.5)
Top Overlay:
  lines w0.2: -5.9,-14.55 -5.9,-15.8 -4.65,-15.8 ; -5.9,-0.85 -5.9,-0.4 -5.1,0.4 -4.65,0.4 ; 5.05,-15.8 6.3,-15.8 6.3,-14.55 ; 5.05,0.4 6.3,0.4 6.3,-0.85

## SQFP10X14-140(N) [mm]
pads (140):
  rect 1.6x0.2 smd: 1(0,0)
  oval 1.6x0.2 smd: 2(0,-0.3) 3(0,-0.6) 4(0,-0.9) 5(0,-1.2) 6(0,-1.5) 7(0,-1.8) 8(0,-2.1) 9(0,-2.4) 10(0,-2.7) 11(0,-3) 12(0,-3.3) 13(0,-3.6) 14(0,-3.9) 15(0,-4.2) 16(0,-4.5) 17(0,-4.8) 18(0,-5.1) 19(0,-5.4) 20(0,-5.7) 21(0,-6) 22(0,-6.3) 23(0,-6.6) 24(0,-6.9) 25(0,-7.2) 26(0,-7.5) 27(0,-7.8) 28(0,-8.1) 29(0,-8.4) 30(0,-8.7) 31(0,-9) 32(0,-9.3) 33(0,-9.6) 34(0,-9.9) 35(0,-10.2) 36(0,-10.5) 37(0,-10.8) 38(0,-11.1) 39(0,-11.4) 40(0,-11.7) 41(0,-12) 42(0,-12.3) 71(11.4,-12.3) 72(11.4,-12) 73(11.4,-11.7) 74(11.4,-11.4) 75(11.4,-11.1) 76(11.4,-10.8) 77(11.4,-10.5) 78(11.4,-10.2) 79(11.4,-9.9) 80(11.4,-9.6) 81(11.4,-9.3) 82(11.4,-9) 83(11.4,-8.7) 84(11.4,-8.4) 85(11.4,-8.1) 86(11.4,-7.8) 87(11.4,-7.5) 88(11.4,-7.2) 89(11.4,-6.9) 90(11.4,-6.6) 91(11.4,-6.3) 92(11.4,-6) 93(11.4,-5.7) 94(11.4,-5.4) 95(11.4,-5.1) 96(11.4,-4.8) 97(11.4,-4.5) 98(11.4,-4.2) 99(11.4,-3.9) 100(11.4,-3.6) 101(11.4,-3.3) 102(11.4,-3) 103(11.4,-2.7) 104(11.4,-2.4) 105(11.4,-2.1) 106(11.4,-1.8) 107(11.4,-1.5) 108(11.4,-1.2) 109(11.4,-0.9) 110(11.4,-0.6) 111(11.4,-0.3) 112(11.4,0)
  oval 0.2x1.6 smd: 43(1.65,-13.85) 44(1.95,-13.85) 45(2.25,-13.85) 46(2.55,-13.85) 47(2.85,-13.85) 48(3.15,-13.85) 49(3.45,-13.85) 50(3.75,-13.85) 51(4.05,-13.85) 52(4.35,-13.85) 53(4.65,-13.85) 54(4.95,-13.85) 55(5.25,-13.85) 56(5.55,-13.85) 57(5.85,-13.85) 58(6.15,-13.85) 59(6.45,-13.85) 60(6.75,-13.85) 61(7.05,-13.85) 62(7.35,-13.85) 63(7.65,-13.85) 64(7.95,-13.85) 65(8.25,-13.85) 66(8.55,-13.85) 67(8.85,-13.85) 68(9.15,-13.85) 69(9.45,-13.85) 70(9.75,-13.85) 113(9.75,1.55) 114(9.45,1.55) 115(9.15,1.55) 116(8.85,1.55) 117(8.55,1.55) 118(8.25,1.55) 119(7.95,1.55) 120(7.65,1.55) 121(7.35,1.55) 122(7.05,1.55) 123(6.75,1.55) 124(6.45,1.55) 125(6.15,1.55) 126(5.85,1.55) 127(5.55,1.55) 128(5.25,1.55) 129(4.95,1.55) 130(4.65,1.55) 131(4.35,1.55) 132(4.05,1.55) 133(3.75,1.55) 134(3.45,1.55) 135(3.15,1.55) 136(2.85,1.55) 137(2.55,1.55) 138(2.25,1.55) 139(1.95,1.55) 140(1.65,1.55)
Top Overlay:
  lines w0.2: -0.4,-12.9 -0.4,-14.25 1.05,-14.25 ; -0.4,0.6 -0.4,1.15 0.4,1.95 1.05,1.95 ; 10.35,-14.25 11.8,-14.25 11.8,-12.9 ; 10.35,1.95 11.8,1.95 11.8,0.6